# Altium footprint library Special.PcbLib: 38 footprints (part 3 of 3)
Each footprint in its own frame and in the unit in brackets; x right, y up, seen from the top. Pads: shape width x height; smd on the part's side, far side on the other; paste and mask are expansions set on the pad; w line width, h text height; cw(c..) or ccw(c..) is an arc to the next point about the centre after c.
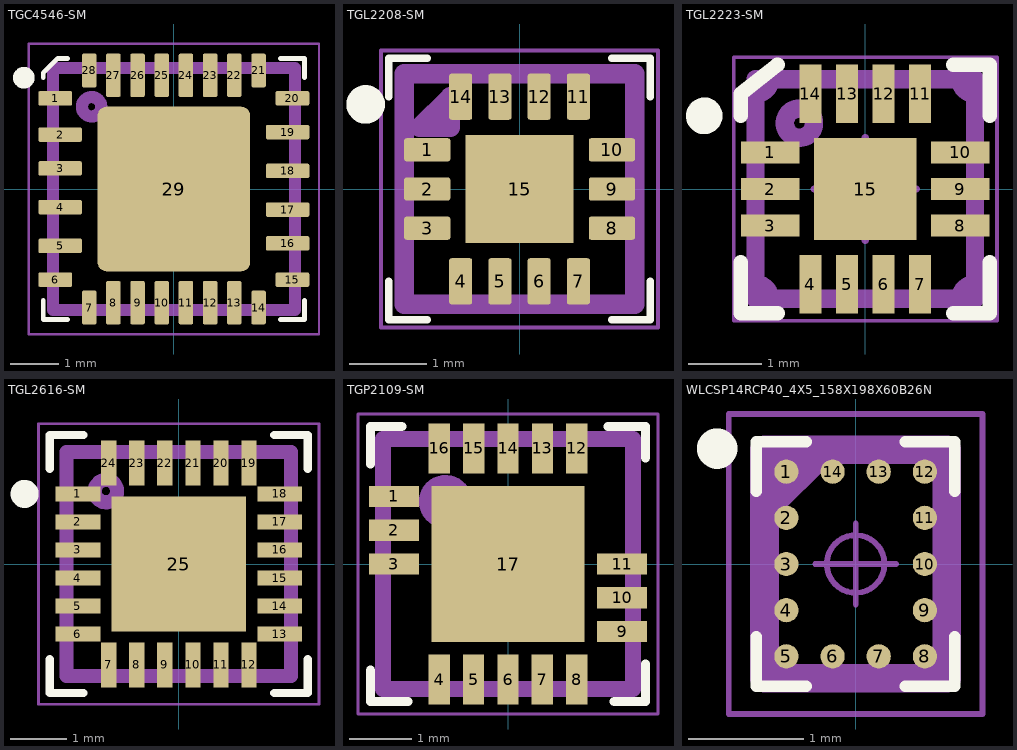
[diagram p2: the footprints below, top view; thin cyan lines are the x and y axes]

## TGC4546-SM [mm] "TriQuint TGC4546-SM"
height 1.4
pads (29):
  rrect25% 0.7x0.3 smd: 1(-2.45,1.875) 6(-2.45,-1.875) 15(2.45,-1.875) 20(2.45,1.875)
  rrect25% 0.9x0.3 smd: 2(-2.35,1.125) 3(-2.35,0.425) 4(-2.35,-0.375) 5(-2.35,-1.175) 16(2.35,-1.125) 17(2.35,-0.425) 18(2.35,0.375) 19(2.35,1.175)
  rrect25% 0.3x0.7 smd: 7(-1.75,-2.45) 14(1.75,-2.45) 21(1.75,2.45) 28(-1.75,2.45)
  rrect25% 0.3x0.9 smd: 8(-1.25,-2.35) 9(-0.75,-2.35) 10(-0.25,-2.35) 11(0.25,-2.35) 12(0.75,-2.35) 13(1.25,-2.35) 22(1.25,2.35) 23(0.75,2.35) 24(0.25,2.35) 25(-0.25,2.35) 26(-0.75,2.35) 27(-1.25,2.35)
  rrect11% 3.15x3.4 smd: 29(0,0)
Top Overlay:
  circle w0.25: c-3.1,2.3 r0.1
  lines w0.1: -2.7,-2.3 -2.7,-2.7 -2.2,-2.7 ; -2.7,2.3 -2.7,2.4 -2.4,2.7 -2.2,2.7 ; 2.2,-2.7 2.7,-2.7 2.7,-2.3 ; 2.2,2.7 2.7,2.7 2.7,2.3
Top Assembly:
  circle w0.25: c-1.7,1.7 r0.2
  lines w0.25: -2.5,-2.5 2.5,-2.5 2.5,2.5 -2.5,2.5 -2.5,-2.5
  text ".Designator" at -1.625,-0.325 h1.5
Top Courtyard:
  circle w0.05: c0,0 r0.3
  lines w0.05: -0.5,0 0.5,0 ; 0,-0.5 0,0.5 ; -3,-3 3,-3 3,3 -3,3 -3,-3
3D body "TGC4546-SM.STEP": height 1.4, standoff -0.05, extent -2.5,-2.501 2.5,2.5

## TGL2208-SM [mm] "Qorvo TGL2208-SM"
height 1.7
pads (15):
  rrect20% 0.6x0.3 smd: 1(-1.2,0.51) 2(-1.2,0) 3(-1.2,-0.51) 8(1.2,-0.51) 9(1.2,0) 10(1.2,0.51)
  rrect20% 0.3x0.6 smd: 4(-0.765,-1.2) 5(-0.255,-1.2) 6(0.255,-1.2) 7(0.765,-1.2) 11(0.765,1.2) 12(0.255,1.2) 13(-0.255,1.2) 14(-0.765,1.2)
  rect 1.4x1.4 smd: 15(0,0)
Top Overlay:
  circle w0.3: c-2,1.1 r0.1
  lines w0.1: -1.7,-1.2 -1.7,-1.7 -1.2,-1.7 ; -1.7,1.2 -1.7,1.7 -1.2,1.7 ; 1.2,-1.7 1.7,-1.7 1.7,-1.2 ; 1.2,1.7 1.7,1.7 1.7,1.2
Top Assembly:
  lines w0.25: -1.499,-1.499 1.499,-1.499 1.499,1.499 -1.499,1.499 -1.499,-1.499 ; -1.3,0.8 -0.9,1.2 -0.9,0.8 -1.3,0.8
  text ".Designator" at -1.3,-0.5 h1.5
Top Courtyard:
  circle w0.05: c0,0 r0.3
  lines w0.05: -0.5,0 0.5,0 ; 0,-0.5 0,0.5 ; -1.8,-1.8 -1.8,1.8 1.8,1.8 1.8,-1.8 -1.8,-1.8
3D body "TGL2208-SM.STEP": height 1.78, standoff 0, extent -1.499,-1.499 1.499,1.499

## TGL2223-SM [mm] "TGL2223-SM"
height 1.6
pads (15):
  rect 0.8x0.3 smd: 1(-1.3,0.5) 2(-1.3,0) 3(-1.3,-0.5) 8(1.3,-0.5) 9(1.3,0) 10(1.3,0.5)
  rect 0.3x0.8 smd: 4(-0.75,-1.3) 5(-0.25,-1.3) 6(0.25,-1.3) 7(0.75,-1.3) 11(0.75,1.3) 12(0.25,1.3) 13(-0.25,1.3) 14(-0.75,1.3)
  rect 1.4x1.4 smd: 15(0,0)
Top Overlay:
  circle w0.3: c-2.2,1 r0.1
  lines w0.2: -1.7,-1 -1.7,-1.7 -1.2,-1.7 ; -1.7,1 -1.7,1.3 -1.2,1.7 ; 1.2,-1.7 1.7,-1.7 1.7,-1 ; 1.2,1.7 1.7,1.7 1.7,1
Top Assembly:
  circle w0.25: c-0.9,0.9 r0.2
  lines w0.25: -1.5,-1.3 cw(c-1.5,-1.5) -1.3,-1.5 ; -1.5,1.3 ccw(c-1.5,1.5) -1.3,1.5 ; 1.3,-1.5 cw(c1.5,-1.5) 1.5,-1.3 ; 1.3,1.5 ccw(c1.5,1.5) 1.5,1.3 ; -1.5,-1.5 1.5,-1.5 1.5,1.5 -1.5,1.5 -1.5,-1.5
  text ".Designator" at -1.3,-0.5 h1.5
Top Courtyard:
  circle w0.1: c0,0 r0.3
  lines w0.05: -1.8,-1.8 -1.8,1.8 1.8,1.8 1.8,-1.8 -1.8,-1.8
  lines w0.1: -0.7,0 0.7,0 ; 0,-0.7 0,0.7
3D body "TGL2223-SM.STEP": height 1.61, standoff -0.02, extent -1.5,-1.5 1.5,1.5

## TGL2616-SM [mm] "Qorvo TGL2616-SM"
height 1.77
pads (25):
  rect 0.8x0.27 smd: 1(-1.8,1.25) 2(-1.8,0.75) 3(-1.8,0.25) 4(-1.8,-0.25) 5(-1.8,-0.75) 6(-1.8,-1.25) 13(1.8,-1.25) 14(1.8,-0.75) 15(1.8,-0.25) 16(1.8,0.25) 17(1.8,0.75) 18(1.8,1.25)
  rect 0.27x0.8 smd: 7(-1.25,-1.8) 8(-0.75,-1.8) 9(-0.25,-1.8) 10(0.25,-1.8) 11(0.75,-1.8) 12(1.25,-1.8) 19(1.25,1.8) 20(0.75,1.8) 21(0.25,1.8) 22(-0.25,1.8) 23(-0.75,1.8) 24(-1.25,1.8)
  rect 2.4x2.4 smd: 25(0,0)
Top Overlay:
  circle w0.3: c-2.75,1.25 r0.1
  lines w0.15: -2.3,-1.7 -2.3,-2.3 -1.7,-2.3 ; -2.3,1.7 -2.3,2.3 -1.7,2.3 ; 1.7,-2.3 2.3,-2.3 2.3,-1.7 ; 1.7,2.3 2.3,2.3 2.3,1.7
Top Assembly:
  circle w0.25: c-1.3,1.3 r0.2
  lines w0.25: -2,-2 2,-2 2,2 -2,2 -2,-2
  text ".Designator" at -1.7,-0.5 h1.5
Top Courtyard:
  circle w0.1: c0,0 r0.3
  lines w0.05: -2.5,-2.5 2.5,-2.5 2.5,2.5 -2.5,2.5 -2.5,-2.5
  lines w0.1: -0.7,0 0.7,0 ; 0,-0.7 0,0.7
3D body "TGL2616-SM.STEP": height 1.77, standoff 0, extent -2,-2 2,2

## TGP2109-SM [mm] "Qorvo TGP2109-SM"
height 1.64
pads (17):
  rect 0.8x0.34 smd: 1(-1.825,1.08) 2(-1.825,0.54) 3(-1.825,0) 9(1.825,-1.08) 10(1.825,-0.54) 11(1.825,0)
  rect 0.34x0.8 smd: 4(-1.1,-1.85) 5(-0.55,-1.85) 6(0,-1.85) 7(0.55,-1.85) 8(1.1,-1.85) 12(1.1,1.85) 13(0.55,1.85) 14(0,1.85) 15(-0.55,1.85) 16(-1.1,1.85)
  rect 2.45x2.5 smd: 17(0,0)
Top Overlay:
  lines w0.15: -2.2,-1.7 -2.2,-2.2 -1.6,-2.2 ; -2.2,1.6 -2.2,2.2 -1.7,2.2 ; 1.6,2.2 2.2,2.2 2.2,1.7 ; 1.7,-2.2 2.2,-2.2 2.2,-1.6
Top Assembly:
  circle w0.25: c-1,1 r0.3
  lines w0.25: -2,-2 2,-2 2,2 -2,2 -2,-2
  text ".Designator" at -1.8,-0.5 h1.5
Top Courtyard:
  circle w0.1: c0,0 r0.3
  lines w0.05: -2.4,-2.4 2.4,-2.4 2.4,2.4 -2.4,2.4 -2.4,-2.4
  lines w0.1: -0.7,0 0.7,0 ; 0,-0.7 0,0.7
3D body "TGP2109-SM.STEP": height 1.64, standoff 0, extent -2,-2 2,2

## WLCSP14RCP40_4X5_158X198X60B26N [mm] "WLCSP, 0.40 mm pitch, rect.; 14 pin, 1.58 mm L X 1.98 mm W X 0.602 mm H body (w/reversed pins)"
height 0.602
pads (14):
  round 0.21 smd: 1(-0.6,0.8) 2(-0.6,0.4) 3(-0.6,0) 4(-0.6,-0.4) 5(-0.6,-0.8) 6(-0.2,-0.8) 7(0.2,-0.8) 8(0.6,-0.8) 9(0.6,-0.4) 10(0.6,0) 11(0.6,0.4) 12(0.6,0.8) 13(0.2,0.8) 14(-0.2,0.8)
Top Overlay:
  circle w0.25: c-1.2,1 r0.05
  lines w0.1: -0.86,-0.63 -0.86,-1.06 -0.43,-1.06 ; -0.86,0.63 -0.86,1.06 -0.43,1.06 ; 0.43,-1.06 0.86,-1.06 0.86,-0.63 ; 0.43,1.06 0.86,1.06 0.86,0.63
Top Assembly:
  region: -0.79,0.99 -0.1,0.99 -0.79,0.3
  lines w0.25: -0.79,-0.99 -0.79,0.99 0.79,0.99 0.79,-0.99 -0.79,-0.99
  text ".Designator" at -1.9,1.5 h1.5
Top Courtyard:
  circle w0.05: c0,0 r0.25
  lines w0.05: -0.35,0 0.35,0 ; 0,-0.35 0,0.35 ; -1.1,-1.3 -1.1,1.3 1.1,1.3 1.1,-1.3 -1.1,-1.3
3D body "BGA14RCP40_4X5_158X198X60B26.STEP": height 0.6, standoff 0, extent -0.79,-0.99 0.79,0.99